# Altium footprint library ic.PcbLib: 68 footprints (part 4 of 5)
Each footprint in its own frame and in the unit in brackets; x right, y up, seen from the top. Pads: shape width x height; smd on the part's side, far side on the other; paste and mask are expansions set on the pad; w line width, h text height; cw(c..) or ccw(c..) is an arc to the next point about the centre after c.
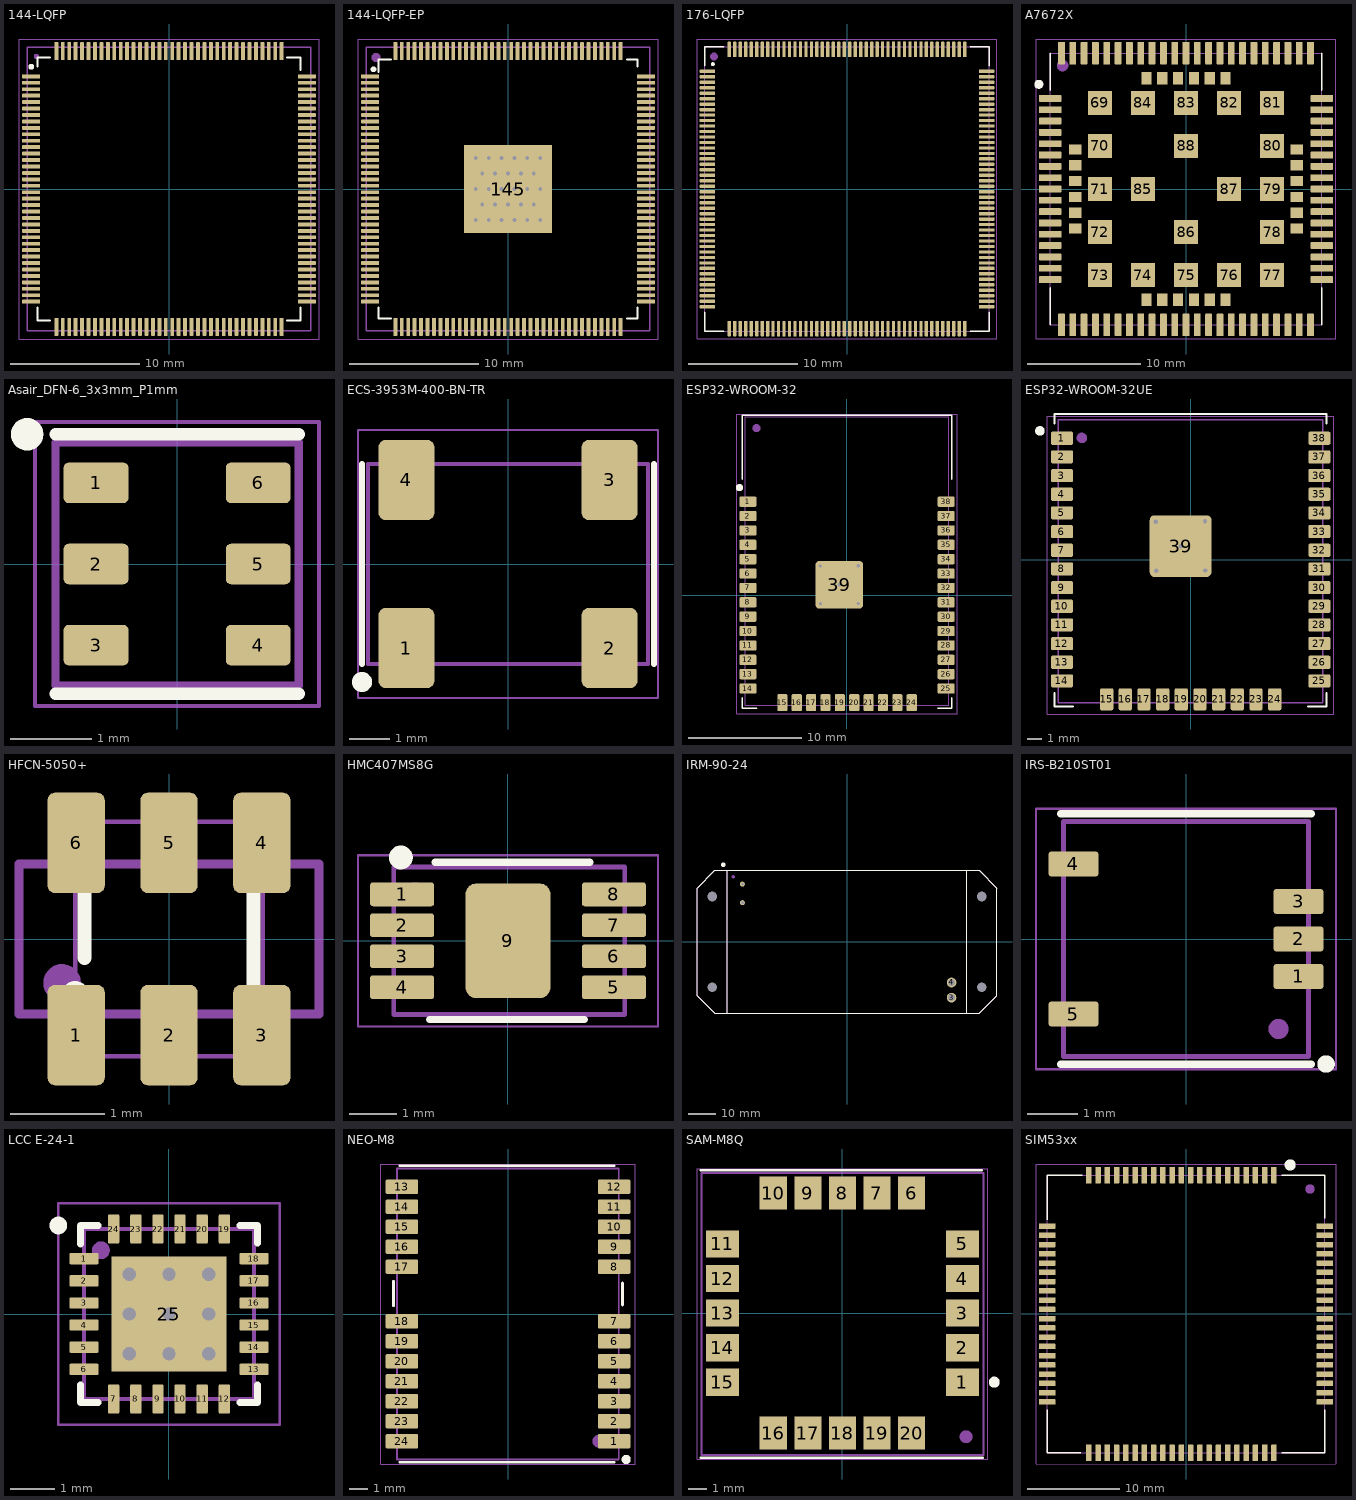
[diagram p3: the footprints below, top view; thin cyan lines are the x and y axes]

## 144-LQFP [mm] "Thin QFP, 144-Leads, Body 20x20mm, Pitch 0.5mm, IPC Medium Density"
height 1.6
pads (144):
  rrect25% 1.4x0.3 smd: 1(-10.7,8.75) 2(-10.7,8.25) 3(-10.7,7.75) 4(-10.7,7.25) 5(-10.7,6.75) 6(-10.7,6.25) 7(-10.7,5.75) 8(-10.7,5.25) 9(-10.7,4.75) 10(-10.7,4.25) 11(-10.7,3.75) 12(-10.7,3.25) 13(-10.7,2.75) 14(-10.7,2.25) 15(-10.7,1.75) 16(-10.7,1.25) 17(-10.7,0.75) 18(-10.7,0.25) 19(-10.7,-0.25) 20(-10.7,-0.75) 21(-10.7,-1.25) 22(-10.7,-1.75) 23(-10.7,-2.25) 24(-10.7,-2.75) 25(-10.7,-3.25) 26(-10.7,-3.75) 27(-10.7,-4.25) 28(-10.7,-4.75) 29(-10.7,-5.25) 30(-10.7,-5.75) 31(-10.7,-6.25) 32(-10.7,-6.75) 33(-10.7,-7.25) 34(-10.7,-7.75) 35(-10.7,-8.25) 36(-10.7,-8.75) 73(10.7,-8.75) 74(10.7,-8.25) 75(10.7,-7.75) 76(10.7,-7.25) 77(10.7,-6.75) 78(10.7,-6.25) 79(10.7,-5.75) 80(10.7,-5.25) 81(10.7,-4.75) 82(10.7,-4.25) 83(10.7,-3.75) 84(10.7,-3.25) 85(10.7,-2.75) 86(10.7,-2.25) 87(10.7,-1.75) 88(10.7,-1.25) 89(10.7,-0.75) 90(10.7,-0.25) 91(10.7,0.25) 92(10.7,0.75) 93(10.7,1.25) 94(10.7,1.75) 95(10.7,2.25) 96(10.7,2.75) 97(10.7,3.25) 98(10.7,3.75) 99(10.7,4.25) 100(10.7,4.75) 101(10.7,5.25) 102(10.7,5.75) 103(10.7,6.25) 104(10.7,6.75) 105(10.7,7.25) 106(10.7,7.75) 107(10.7,8.25) 108(10.7,8.75)
  rrect25% 0.3x1.4 smd: 37(-8.75,-10.7) 38(-8.25,-10.7) 39(-7.75,-10.7) 40(-7.25,-10.7) 41(-6.75,-10.7) 42(-6.25,-10.7) 43(-5.75,-10.7) 44(-5.25,-10.7) 45(-4.75,-10.7) 46(-4.25,-10.7) 47(-3.75,-10.7) 48(-3.25,-10.7) 49(-2.75,-10.7) 50(-2.25,-10.7) 51(-1.75,-10.7) 52(-1.25,-10.7) 53(-0.75,-10.7) 54(-0.25,-10.7) 55(0.25,-10.7) 56(0.75,-10.7) 57(1.25,-10.7) 58(1.75,-10.7) 59(2.25,-10.7) 60(2.75,-10.7) 61(3.25,-10.7) 62(3.75,-10.7) 63(4.25,-10.7) 64(4.75,-10.7) 65(5.25,-10.7) 66(5.75,-10.7) 67(6.25,-10.7) 68(6.75,-10.7) 69(7.25,-10.7) 70(7.75,-10.7) 71(8.25,-10.7) 72(8.75,-10.7) 109(8.75,10.7) 110(8.25,10.7) 111(7.75,10.7) 112(7.25,10.7) 113(6.75,10.7) 114(6.25,10.7) 115(5.75,10.7) 116(5.25,10.7) 117(4.75,10.7) 118(4.25,10.7) 119(3.75,10.7) 120(3.25,10.7) 121(2.75,10.7) 122(2.25,10.7) 123(1.75,10.7) 124(1.25,10.7) 125(0.75,10.7) 126(0.25,10.7) 127(-0.25,10.7) 128(-0.75,10.7) 129(-1.25,10.7) 130(-1.75,10.7) 131(-2.25,10.7) 132(-2.75,10.7) 133(-3.25,10.7) 134(-3.75,10.7) 135(-4.25,10.7) 136(-4.75,10.7) 137(-5.25,10.7) 138(-5.75,10.7) 139(-6.25,10.7) 140(-6.75,10.7) 141(-7.25,10.7) 142(-7.75,10.7) 143(-8.25,10.7) 144(-8.75,10.7)
Top Overlay:
  circle w0.254: c-10.7,9.5 r0.1
  lines w0.15: -10.2,-9.2 -10.2,-10.2 -9.25,-10.2 ; -10.2,9.5 -10.2,10.2 -9.25,10.2 ; 9.15,-10.2 10.2,-10.2 10.2,-9.2 ; 9.15,10.2 10.2,10.2 10.2,9.25
Top Assy:
  circle w0.2: c-10.3,10.3 r0.1
  lines w0.1: -11,-11 11,-11 11,11 -11,11 -11,-11
  text ".Designator" at 0,0 h1
Top Cortyard:
  lines w0.05: -11.65,-11.65 11.65,-11.65 11.65,11.65 -11.65,11.65 -11.65,-11.65
3D body "LQFP-176.STEP": height 2, standoff 0.1, extent -11,-11 11,11

## 144-LQFP-EP [mm] "Thin QFP, 144-Leads, Body 20x20mm, Pitch 0.5mm, IPC Medium Density"
height 1.6
pads (173):
  rrect25% 1.4x0.3 smd: 1(-10.7,8.75) 2(-10.7,8.25) 3(-10.7,7.75) 4(-10.7,7.25) 5(-10.7,6.75) 6(-10.7,6.25) 7(-10.7,5.75) 8(-10.7,5.25) 9(-10.7,4.75) 10(-10.7,4.25) 11(-10.7,3.75) 12(-10.7,3.25) 13(-10.7,2.75) 14(-10.7,2.25) 15(-10.7,1.75) 16(-10.7,1.25) 17(-10.7,0.75) 18(-10.7,0.25) 19(-10.7,-0.25) 20(-10.7,-0.75) 21(-10.7,-1.25) 22(-10.7,-1.75) 23(-10.7,-2.25) 24(-10.7,-2.75) 25(-10.7,-3.25) 26(-10.7,-3.75) 27(-10.7,-4.25) 28(-10.7,-4.75) 29(-10.7,-5.25) 30(-10.7,-5.75) 31(-10.7,-6.25) 32(-10.7,-6.75) 33(-10.7,-7.25) 34(-10.7,-7.75) 35(-10.7,-8.25) 36(-10.7,-8.75) 73(10.7,-8.75) 74(10.7,-8.25) 75(10.7,-7.75) 76(10.7,-7.25) 77(10.7,-6.75) 78(10.7,-6.25) 79(10.7,-5.75) 80(10.7,-5.25) 81(10.7,-4.75) 82(10.7,-4.25) 83(10.7,-3.75) 84(10.7,-3.25) 85(10.7,-2.75) 86(10.7,-2.25) 87(10.7,-1.75) 88(10.7,-1.25) 89(10.7,-0.75) 90(10.7,-0.25) 91(10.7,0.25) 92(10.7,0.75) 93(10.7,1.25) 94(10.7,1.75) 95(10.7,2.25) 96(10.7,2.75) 97(10.7,3.25) 98(10.7,3.75) 99(10.7,4.25) 100(10.7,4.75) 101(10.7,5.25) 102(10.7,5.75) 103(10.7,6.25) 104(10.7,6.75) 105(10.7,7.25) 106(10.7,7.75) 107(10.7,8.25) 108(10.7,8.75)
  rrect25% 0.3x1.4 smd: 37(-8.75,-10.7) 38(-8.25,-10.7) 39(-7.75,-10.7) 40(-7.25,-10.7) 41(-6.75,-10.7) 42(-6.25,-10.7) 43(-5.75,-10.7) 44(-5.25,-10.7) 45(-4.75,-10.7) 46(-4.25,-10.7) 47(-3.75,-10.7) 48(-3.25,-10.7) 49(-2.75,-10.7) 50(-2.25,-10.7) 51(-1.75,-10.7) 52(-1.25,-10.7) 53(-0.75,-10.7) 54(-0.25,-10.7) 55(0.25,-10.7) 56(0.75,-10.7) 57(1.25,-10.7) 58(1.75,-10.7) 59(2.25,-10.7) 60(2.75,-10.7) 61(3.25,-10.7) 62(3.75,-10.7) 63(4.25,-10.7) 64(4.75,-10.7) 65(5.25,-10.7) 66(5.75,-10.7) 67(6.25,-10.7) 68(6.75,-10.7) 69(7.25,-10.7) 70(7.75,-10.7) 71(8.25,-10.7) 72(8.75,-10.7) 109(8.75,10.7) 110(8.25,10.7) 111(7.75,10.7) 112(7.25,10.7) 113(6.75,10.7) 114(6.25,10.7) 115(5.75,10.7) 116(5.25,10.7) 117(4.75,10.7) 118(4.25,10.7) 119(3.75,10.7) 120(3.25,10.7) 121(2.75,10.7) 122(2.25,10.7) 123(1.75,10.7) 124(1.25,10.7) 125(0.75,10.7) 126(0.25,10.7) 127(-0.25,10.7) 128(-0.75,10.7) 129(-1.25,10.7) 130(-1.75,10.7) 131(-2.25,10.7) 132(-2.75,10.7) 133(-3.25,10.7) 134(-3.75,10.7) 135(-4.25,10.7) 136(-4.75,10.7) 137(-5.25,10.7) 138(-5.75,10.7) 139(-6.25,10.7) 140(-6.75,10.7) 141(-7.25,10.7) 142(-7.75,10.7) 143(-8.25,10.7) 144(-8.75,10.7)
  round 0.7 hole 0.3: 145(-2.5,-2.4) 145(-2.5,0) 145(-2.5,2.4) 145(-2,-1.2) 145(-2,1.2) 145(-1.5,-2.4) 145(-1.5,0) 145(-1.5,2.4) 145(-1,-1.2) 145(-1,1.2) 145(-0.5,-2.4) 145(-0.5,0) 145(-0.5,2.4) 145(0,-1.2) 145(0,1.2) 145(0.5,-2.4) 145(0.5,0) 145(0.5,2.4) 145(1,-1.2) 145(1,1.2) 145(1.5,-2.4) 145(1.5,0) 145(1.5,2.4) 145(2,-1.2) 145(2,1.2) 145(2.5,-2.4) 145(2.5,0) 145(2.5,2.4)
  rect 6.85x6.85 smd: 145(0,0)
Top Overlay:
  lines w0.15: -10.05,-9.2 -10.05,-10.05 -9.1,-10.05 ; -10.05,9.1 -10.05,10.05 -9.1,10.05 ; 9.25,-10.05 10.05,-10.05 10.05,-9.2 ; 9.25,10.05 10.05,10.05 10.05,9.5
  lines w0.254: -10.355,9.268 cw(c-10.45,9.3) -10.35,9.3
Top Assy:
  lines w0.1: -11,-11 -11,11 11,11 11,-11 -11,-11
  lines w0.5: -10.15,10.2 cw(c-10.249,10.211) -10.149,10.211
  text ".Designator" at 0,0 h1
Top Cortyard:
  lines w0.05: -11.65,-11.65 -11.65,11.65 11.65,11.65 11.65,-11.65 -11.65,-11.65
  lines w0.1: -0.5,0 0.5,0 -0.5,0 ; 0,-0.5 0,0.5 0,-0.5
3D body "LQFP-176.STEP": height 2, standoff 0.1, extent -11,-11 11,11

## 176-LQFP [mm]
pads (176):
  rrect25% 1.4x0.3 smd: 1(-12.75,10.75) 2(-12.75,10.25) 3(-12.75,9.75) 4(-12.75,9.25) 5(-12.75,8.75) 6(-12.75,8.25) 7(-12.75,7.75) 8(-12.75,7.25) 9(-12.75,6.75) 10(-12.75,6.25) 11(-12.75,5.75) 12(-12.75,5.25) 13(-12.75,4.75) 14(-12.75,4.25) 15(-12.75,3.75) 16(-12.75,3.25) 17(-12.75,2.75) 18(-12.75,2.25) 19(-12.75,1.75) 20(-12.75,1.25) 21(-12.75,0.75) 22(-12.75,0.25) 23(-12.75,-0.25) 24(-12.75,-0.75) 25(-12.75,-1.25) 26(-12.75,-1.75) 27(-12.75,-2.25) 28(-12.75,-2.75) 29(-12.75,-3.25) 30(-12.75,-3.75) 31(-12.75,-4.25) 32(-12.75,-4.75) 33(-12.75,-5.25) 34(-12.75,-5.75) 35(-12.75,-6.25) 36(-12.75,-6.75) 37(-12.75,-7.25) 38(-12.75,-7.75) 39(-12.75,-8.25) 40(-12.75,-8.75) 41(-12.75,-9.25) 42(-12.75,-9.75) 43(-12.75,-10.25) 44(-12.75,-10.75) 89(12.75,-10.75) 90(12.75,-10.25) 91(12.75,-9.75) 92(12.75,-9.25) 93(12.75,-8.75) 94(12.75,-8.25) 95(12.75,-7.75) 96(12.75,-7.25) 97(12.75,-6.75) 98(12.75,-6.25) 99(12.75,-5.75) 100(12.75,-5.25) 101(12.75,-4.75) 102(12.75,-4.25) 103(12.75,-3.75) 104(12.75,-3.25) 105(12.75,-2.75) 106(12.75,-2.25) 107(12.75,-1.75) 108(12.75,-1.25) 109(12.75,-0.75) 110(12.75,-0.25) 111(12.75,0.25) 112(12.75,0.75) 113(12.75,1.25) 114(12.75,1.75) 115(12.75,2.25) 116(12.75,2.75) 117(12.75,3.25) 118(12.75,3.75) 119(12.75,4.25) 120(12.75,4.75) 121(12.75,5.25) 122(12.75,5.75) 123(12.75,6.25) 124(12.75,6.75) 125(12.75,7.25) 126(12.75,7.75) 127(12.75,8.25) 128(12.75,8.75) 129(12.75,9.25) 130(12.75,9.75) 131(12.75,10.25) 132(12.75,10.75)
  rrect25% 0.3x1.4 smd: 45(-10.75,-12.75) 46(-10.25,-12.75) 47(-9.75,-12.75) 48(-9.25,-12.75) 49(-8.75,-12.75) 50(-8.25,-12.75) 51(-7.75,-12.75) 52(-7.25,-12.75) 53(-6.75,-12.75) 54(-6.25,-12.75) 55(-5.75,-12.75) 56(-5.25,-12.75) 57(-4.75,-12.75) 58(-4.25,-12.75) 59(-3.75,-12.75) 60(-3.25,-12.75) 61(-2.75,-12.75) 62(-2.25,-12.75) 63(-1.75,-12.75) 64(-1.25,-12.75) 65(-0.75,-12.75) 66(-0.25,-12.75) 67(0.25,-12.75) 68(0.75,-12.75) 69(1.25,-12.75) 70(1.75,-12.75) 71(2.25,-12.75) 72(2.75,-12.75) 73(3.25,-12.75) 74(3.75,-12.75) 75(4.25,-12.75) 76(4.75,-12.75) 77(5.25,-12.75) 78(5.75,-12.75) 79(6.25,-12.75) 80(6.75,-12.75) 81(7.25,-12.75) 82(7.75,-12.75) 83(8.25,-12.75) 84(8.75,-12.75) 85(9.25,-12.75) 86(9.75,-12.75) 87(10.25,-12.75) 88(10.75,-12.75) 133(10.75,12.75) 134(10.25,12.75) 135(9.75,12.75) 136(9.25,12.75) 137(8.75,12.75) 138(8.25,12.75) 139(7.75,12.75) 140(7.25,12.75) 141(6.75,12.75) 142(6.25,12.75) 143(5.75,12.75) 144(5.25,12.75) 145(4.75,12.75) 146(4.25,12.75) 147(3.75,12.75) 148(3.25,12.75) 149(2.75,12.75) 150(2.25,12.75) 151(1.75,12.75) 152(1.25,12.75) 153(0.75,12.75) 154(0.25,12.75) 155(-0.25,12.75) 156(-0.75,12.75) 157(-1.25,12.75) 158(-1.75,12.75) 159(-2.25,12.75) 160(-2.75,12.75) 161(-3.25,12.75) 162(-3.75,12.75) 163(-4.25,12.75) 164(-4.75,12.75) 165(-5.25,12.75) 166(-5.75,12.75) 167(-6.25,12.75) 168(-6.75,12.75) 169(-7.25,12.75) 170(-7.75,12.75) 171(-8.25,12.75) 172(-8.75,12.75) 173(-9.25,12.75) 174(-9.75,12.75) 175(-10.25,12.75) 176(-10.75,12.75)
Top Overlay:
  circle w0.254: c-12.25,11.4 r0.05
  lines w0.15: -13,-11.25 -13,-13 -11.25,-13 ; -13,11.25 -13,13 -11.25,13 ; 11.25,-13 13,-13 13,-11.25 ; 11.25,13 13,13 13,11.25
Top Assy:
  lines w0.1: -13,-13 13,-13 13,13 -13,13 -13,-13
  lines w0.5: -12.061,12.145 ccw(c-12.15,12.1) -12.05,12.1
  text ".Designator" at 0,0 h1
Top Cortyard:
  lines w0.05: -13.7,-13.7 -13.7,13.7 13.7,13.7 13.7,-13.7 -13.7,-13.7
3D body: height 1.6, standoff 0, extent -12,-12 12,12

## A7672X [mm]
pads (124):
  rrect25% 2x0.6 smd: 1(-12,8) 2(-12,7) 3(-12,6) 4(-12,5) 5(-12,4) 6(-12,3) 7(-12,2) 8(-12,1) 9(-12,0) 10(-12,-1) 11(-12,-2) 12(-12,-3) 13(-12,-4) 14(-12,-5) 15(-12,-6) 16(-12,-7) 17(-12,-8) 35(12,-8) 36(12,-7) 37(12,-6) 38(12,-5) 39(12,-4) 40(12,-3) 41(12,-2) 42(12,-1) 43(12,0) 44(12,1) 45(12,2) 46(12,3) 47(12,4) 48(12,5) 49(12,6) 50(12,7) 51(12,8)
  rrect25% 0.6x2 smd: 18(-8,-12) 19(-7,-12) 20(-6,-12) 21(-5,-12) 22(-4,-12) 23(-3,-12) 24(-2,-12) 25(-1,-12) 26(0,-12) 27(1,-12) 28(2,-12) 29(3,-12) 30(4,-12) 31(5,-12) 32(6,-12) 33(7,-12) 34(8,-12) 52(8,12) 53(7,12) 54(6,12) 55(5,12) 56(4,12) 57(3,12) 58(2,12) 59(1,12) 60(0,12) 61(-1,12) 62(-2,12) 63(-3,12) 64(-4,12) 65(-5,12) 66(-6,12) 67(-7,12) 68(-8,12) 89(-11,-12) 90(-10,-12) 91(-9,-12) 92(9,-12) 93(10,-12) 94(11,-12) 95(11,12) 96(10,12) 97(9,12) 98(-9,12) 99(-10,12) 100(-11,12)
  rect 2.1x2.1 smd: 69(-7.6,7.6) 70(-7.6,3.8) 71(-7.6,0) 72(-7.6,-3.8) 73(-7.6,-7.6) 74(-3.8,-7.6) 75(0,-7.6) 76(3.8,-7.6) 77(7.6,-7.6) 78(7.6,-3.8) 79(7.6,0) 80(7.6,3.8) 81(7.6,7.6) 82(3.8,7.6) 83(0,7.6) 84(-3.8,7.6) 85(-3.8,0) 86(0,-3.8) 87(3.8,0) 88(0,3.8)
  rect 1.1x0.9 smd: 101(-9.8,3.5) 102(-9.8,2.1) 103(-9.8,0.7) 104(-9.8,-0.7) 105(-9.8,-2.1) 106(-9.8,-3.5) 113(9.8,-3.5) 114(9.8,-2.1) 115(9.8,-0.7) 116(9.8,0.7) 117(9.8,2.1) 118(9.8,3.5)
  rect 0.9x1.1 smd: 107(-3.5,-9.8) 108(-2.1,-9.8) 109(-0.7,-9.8) 110(0.7,-9.8) 111(2.1,-9.8) 112(3.5,-9.8) 119(3.5,9.8) 120(2.1,9.8) 121(0.7,9.8) 122(-0.7,9.8) 123(-2.1,9.8) 124(-3.5,9.8)
Top Overlay:
  circle w0.4: c-13,9.25 r0.2
  lines w0.15: -12,-12 -12,-8.75 ; -12,8.75 -12,12 ; 12,-12 12,-8.75 ; 12,8.75 12,12
Top Assy:
  circle w0.8: c-10.9,10.9 r0.1
  lines w0.1: -12,-12 12,-12 12,12 -12,12 -12,-12
  text ".Designator" at 0,0 h1
Top Cortyard:
  lines w0.05: -13.25,-13.25 13.25,-13.25 13.25,13.25 -13.25,13.25 -13.25,-13.25
3D body "step_temp.STEP": height 2.6, standoff 0, extent -12,-12 12,12

## Asair_DFN-6_3x3mm_P1mm [mm]
height 2
pads (6):
  rrect25% 0.8x0.5 smd: 1(-1,1) 2(-1,0) 3(-1,-1) 4(1,-1) 5(1,0) 6(1,1)
Top Overlay:
  circle w0.2: c-1.85,1.6 r0.1
  lines w0.15: -1.5,-1.6 1.5,-1.6 ; -1.5,1.6 1.5,1.6
Top Assy:
  circle w0.2: c-1.05,1 r0.1
  lines w0.1: -1.5,-1.5 1.5,-1.5 1.5,1.5 -1.5,1.5 -1.5,-1.5
  text ".Designator" at 0,0 h1
Top Cortyard:
  lines w0.05: -1.75,-1.75 1.75,-1.75 1.75,1.75 -1.75,1.75 -1.75,-1.75
3D body "User Library-dfn6_3x3_rm0_95.step": height 0.8, standoff 0, extent -1.55,-1.5 1.55,1.5

## ECS-3953M-400-BN-TR [mm]
height 2.1
pads (4):
  rrect25% 1.4x2 smd: 1(-2.54,-2.1) 2(2.54,-2.1) 3(2.54,2.1) 4(-2.54,2.1)
Top Overlay:
  circle w0.3: c-3.65,-2.95 r0.1
  lines w0.15: -3.65,-2.5 -3.65,2.5 ; 3.65,-2.5 3.65,2.5
Top Assy:
  circle w0.2: c-2.7,-1.8 r0.1
  lines w0.1: -3.5,-2.5 -3.5,2.5 3.5,2.5 3.5,-2.5 -3.5,-2.5
  text ".Designator" at 0,0 h1
Top Cortyard:
  lines w0.05: -3.75,-3.35 -3.75,3.35 3.75,3.35 3.75,-3.35 -3.75,-3.35
3D body "ECS-3953M-400-BN-TR.step": height 1.7, standoff 0, extent -3.5,-2.5 3.5,2.5

## ESP32-WROOM-32 [mm]
height 3.1
pads (39):
  rrect25% 1.5x0.9 smd: 1(-8.75,8.25) 2(-8.75,6.98) 3(-8.75,5.71) 4(-8.75,4.44) 5(-8.75,3.17) 6(-8.75,1.9) 7(-8.75,0.63) 8(-8.75,-0.64) 9(-8.75,-1.91) 10(-8.75,-3.18) 11(-8.75,-4.45) 12(-8.75,-5.72) 13(-8.75,-6.99) 14(-8.75,-8.26) 25(8.76,-8.26) 26(8.76,-6.99) 27(8.76,-5.72) 28(8.76,-4.45) 29(8.76,-3.18) 30(8.76,-1.91) 31(8.76,-0.64) 32(8.76,0.63) 33(8.76,1.9) 34(8.76,3.17) 35(8.76,4.44) 36(8.76,5.71) 37(8.76,6.98) 38(8.76,8.25)
  rrect25% 0.9x1.5 smd: 15(-5.71,-9.51) 16(-4.44,-9.51) 17(-3.17,-9.51) 18(-1.9,-9.51) 19(-0.63,-9.51) 20(0.64,-9.51) 21(1.91,-9.51) 22(3.18,-9.51) 23(4.45,-9.51) 24(5.72,-9.51)
  rrect15% 4.2x4.2 smd: 39(-0.68,0.91)
via -2.34,-0.77 diameter 0.6 hole 0.3
via -2.36,2.57 diameter 0.6 hole 0.3
via 0.98,2.59 diameter 0.6 hole 0.3
via 1,-0.75 diameter 0.6 hole 0.3
via -0.68,0.91 diameter 0.6 hole 0.3
Top Overlay:
  circle w0.4: c-9.5,9.5 r0.125
  lines w0.15: -9.25,-9.1 -9.25,-10 -8,-10 ; -9.25,10.25 -9.25,15.9 9.25,15.9 9.25,10.25 ; 8.01,-10 9.25,-10 9.25,-9.1
Top Assy:
  circle w0.5: c-8,14.75 r0.1
  lines w0.1: -9,15.74 -9,-9.75 9,-9.75 9,15.75 -9,15.75
  text ".Designator" at 0,0 h1
Top Cortyard:
  lines w0.05: -9.75,-10.51 9.75,-10.51 9.75,16 -9.75,16 -9.75,-10.51
3D body "ESP32-WROOM-32.step": height 3.1, standoff 0, extent -9,-9.755 9,15.745

## ESP32-WROOM-32UE [mm]
height 3.1
pads (39):
  rrect25% 1.5x0.9 smd: 1(-8.75,8.25) 2(-8.75,6.98) 3(-8.75,5.71) 4(-8.75,4.44) 5(-8.75,3.17) 6(-8.75,1.9) 7(-8.75,0.63) 8(-8.75,-0.64) 9(-8.75,-1.91) 10(-8.75,-3.18) 11(-8.75,-4.45) 12(-8.75,-5.72) 13(-8.75,-6.99) 14(-8.75,-8.26) 25(8.76,-8.26) 26(8.76,-6.99) 27(8.76,-5.72) 28(8.76,-4.45) 29(8.76,-3.18) 30(8.76,-1.91) 31(8.76,-0.64) 32(8.76,0.63) 33(8.76,1.9) 34(8.76,3.17) 35(8.76,4.44) 36(8.76,5.71) 37(8.76,6.98) 38(8.76,8.25)
  rrect25% 0.9x1.5 smd: 15(-5.71,-9.51) 16(-4.44,-9.51) 17(-3.17,-9.51) 18(-1.9,-9.51) 19(-0.63,-9.51) 20(0.64,-9.51) 21(1.91,-9.51) 22(3.18,-9.51) 23(4.45,-9.51) 24(5.72,-9.51)
  rrect15% 4.2x4.2 smd: 39(-0.68,0.91)
via -0.68,0.91 diameter 0.6 hole 0.3
via 1,-0.75 diameter 0.6 hole 0.3
via 0.98,2.59 diameter 0.6 hole 0.3
via -2.36,2.57 diameter 0.6 hole 0.3
via -2.34,-0.77 diameter 0.6 hole 0.3
Top Overlay:
  circle w0.4: c-10.25,8.75 r0.125
  lines w0.15: -9.25,-9.1 -9.25,-10 -8,-10 ; -9.25,9.25 -9.25,9.9 9.25,9.9 9.25,9.25 ; 8.01,-10 9.25,-10 9.25,-9.1
Top Assy:
  circle w0.5: c-7.4,8.275 r0.1
  lines w0.1: -9,-9.75 9,-9.75 9,9.5 -9,9.5 -9,-9.75
  text ".Designator" at 0,0 h1
Top Cortyard:
  lines w0.05: -9.75,-10.51 -9.75,9.75 9.75,9.75 9.75,-10.51 -9.75,-10.51
3D body "ESP32-WROOM-32UE 3D Model.STEP": height 3.23, standoff 0.03, extent -9,-9.75 9,9.45

## HFCN-5050+ [mm]
pads (6):
  rrect25% 0.61x1.07 smd: 1(-0.99,-1.025) 2(0,-1.025) 3(0.99,-1.025) 4(0.99,1.025) 5(0,1.025) 6(-0.99,1.025)
Top Overlay:
  circle w0.2: c-1,-0.6 r0.05
  lines w0.15: -0.9,-0.2 -0.9,0.8 ; 0.9,-0.8 0.9,0.75
Top Assy:
  circle w0.2: c-1.141,-0.468 r0.1
  lines w0.1: -1.6,-0.8 -1.6,0.8 1.6,0.8 1.6,-0.8 -1.6,-0.8
  text ".Designator" at -0.957,-0.349 h0.75
Top Cortyard:
  lines w0.05: -1,-1.25 1,-1.25 1,1.25 -1,1.25 -1,-1.25
3D body: height 0.89, standoff 0, extent -1.6,-0.8 1.6,0.8

## HMC407MS8G [mm]
height 1.1
pads (9):
  rrect25% 1.35x0.5 smd: 1(-2.225,0.975) 2(-2.225,0.325) 3(-2.225,-0.325) 4(-2.225,-0.975) 5(2.225,-0.975) 6(2.225,-0.325) 7(2.225,0.325) 8(2.225,0.975)
  rrect25% 1.78x2.41 smd: 9(0,0)
Top Overlay:
  circle w0.25: c-2.25,1.75 r0.125
  lines w0.15: -1.65,-1.65 1.6,-1.65 ; -1.531,1.65 1.719,1.65
Board:
  lines w0.1: -0.5,0 0.5,0 ; 0,-0.5 0,0.5
Top Assy:
  circle w0.35: c-1.95,1 r0.05
  lines w0.1: -2.4,-1.55 -2.4,1.55 2.45,1.55 2.45,-1.55 1.238,-1.55 0.35,-1.55 -0.088,-1.55 -2.4,-1.55
  text ".Designator" at -0.05,-0.117 h1
Top Cortyard:
  lines w0.05: -3.15,-1.8 -3.15,1.8 3.15,1.8 3.15,-1.8 -3.15,-1.8
3D body "HMC407MS8G.step": height 1.1, standoff 0, extent -2.44,-1.55 2.44,1.55

## IRM-90-24 [mm]
height 1
pads (8):
  round 1.8 hole 1.2 unplated: 1(-38,21) 2(-38,14.25)
  round 3.5 hole 2.5 unplated: 3(38,-20.25) 4(38,-14.75)
  round 0 hole 3.5 unplated mask+1.9: 11(-49,16.5) 11(49,16.5) 12(-49,-16.5) 12(49,-16.5)
Top Overlay:
  circle w1.5: c-45,28 r0.1
  lines w0.2: -54.5,-19.5 -54.5,19.5 -48,26 48,26 54.5,19.5 54.5,-19.5 48,-26 -48,-26 -54.5,-19.5 ; -43.5,-26 43.5,-26 43.5,26 -43.5,26 -43.5,-26
Top Assy:
  circle w1: c-41.3,23.65 r0.1
  lines w0.1: -43.5,-26 -43.5,26 43.497,26 43.497,-26 -43.5,-26
Top Cortyard:
  lines w0.2: -54.5,-19.5 -54.5,19.5 -48,26 48,26 54.5,19.5 54.5,-19.5 48,-26 -48,-26 -54.5,-19.5
3D body: height 33.5, standoff 0, extent -43.5,-26 43.5,26

## IRS-B210ST01 [mm]
pads (5):
  rrect25% 1x0.5 smd: 1(2.25,-0.75) 2(2.25,0) 3(2.25,0.75) 4(-2.25,1.5) 5(-2.25,-1.5)
Top Overlay:
  circle w0.25: c2.8,-2.5 r0.05
  lines w0.15: -2.5,-2.5 2.5,-2.5 ; -2.5,2.5 2.5,2.5
Top Assy:
  circle w0.2: c1.85,-1.8 r0.1
  lines w0.1: -2.45,-2.35 -2.45,2.35 2.45,2.35 2.45,-2.35 -2.45,-2.35
  text ".Designator" at 0,0 h1
Top Cortyard:
  lines w0.05: -3,-2.6 -3,2.6 3,2.6 3,-2.5 3,-2.6 -3,-2.6
3D body: height 2.2, standoff 0, extent -2.45,-2.372 2.466,2.35

## LCC E-24-1 [mm] "HMC525ALC4"
height 0.8
pads (25):
  rrect25% 0.66x0.254 smd mask+0: 1(-1.92,1.25) 2(-1.92,0.75) 3(-1.92,0.25) 4(-1.92,-0.25) 5(-1.92,-0.75) 6(-1.92,-1.25) 13(1.92,-1.25) 14(1.92,-0.75) 15(1.92,-0.25) 16(1.92,0.25) 17(1.92,0.75) 18(1.92,1.25)
  rrect25% 0.254x0.66 smd mask+0: 7(-1.25,-1.92) 8(-0.75,-1.92) 9(-0.25,-1.92) 10(0.25,-1.92) 11(0.75,-1.92) 12(1.25,-1.92) 19(1.25,1.92) 20(0.75,1.92) 21(0.25,1.92) 22(-0.25,1.92) 23(-0.75,1.92) 24(-1.25,1.92)
  rect 2.6x2.6 smd: 25(0,0)
via -0.9,-0.9 diameter 0.6 hole 0.3
via 0.9,-0.9 diameter 0.6 hole 0.3
via 0.9,0.9 diameter 0.6 hole 0.3
via -0.9,0.9 diameter 0.6 hole 0.3
via 0,-0.9 diameter 0.6 hole 0.3
via 0.9,0 diameter 0.6 hole 0.3
via 0,0.9 diameter 0.6 hole 0.3
via -0.9,0 diameter 0.6 hole 0.3
via 0,0 diameter 0.6 hole 0.3
Top Overlay:
  circle w0.2: c-2.5,2 r0.1
  lines w0.15: -2,-1.6 -2,-2 -1.6,-2 ; -2,1.58 -2,1.98 ; -2,2 -1.6,2 ; 1.6,-2 2,-2 2,-1.6 ; 1.6,2 2,2 2,1.6
Top Solder:
  region: -1.538,-1.5 -1.538,1.44 -2.3,1.44 -2.3,-1.5
  region: 1.5,-1.538 -1.44,-1.538 -1.44,-2.3 1.5,-2.3
  region: 1.538,1.5 1.538,-1.44 2.3,-1.44 2.3,1.5
  rectangle: -1.5,1.538 1.44,2.3
Top Assy:
  circle w0.2: c-1.538,1.44 r0.1
  lines w0.1: -1.92,-1.92 -1.92,1.92 1.92,1.92 1.92,-1.92 -1.92,-1.92
  text ".Designator" at 0,0 h1
Top Cortyard:
  lines w0.05: -2.5,-2.5 -2.5,2.5 2.5,2.5 2.5,-2.5 -2.5,-2.5
3D body "User Library-LCC24_E24_1.STEP": height 1, standoff -0.03, extent -1.98,-1.95 1.92,1.95

## NEO-M8 [mm] "u-blox NEO GNSS module"
pads (24):
  rrect25% 1.8x0.8 smd: 1(5.842,-7) 2(5.842,-5.9) 3(5.842,-4.8) 4(5.842,-3.7) 5(5.842,-2.6) 6(5.842,-1.5) 7(5.842,-0.4) 8(5.842,2.6) 9(5.842,3.7) 10(5.842,4.8) 11(5.842,5.9) 12(5.842,7) 13(-5.842,7) 14(-5.842,5.9) 15(-5.842,4.8) 16(-5.842,3.7) 17(-5.842,2.6) 18(-5.842,-0.4) 19(-5.842,-1.5) 20(-5.842,-2.6) 21(-5.842,-3.7) 22(-5.842,-4.8) 23(-5.842,-5.9) 24(-5.842,-7)
Top Overlay:
  circle w0.3: c6.5,-8 r0.1
  lines w0.15: -6.3,0.45 -6.3,1.8 ; -5.95,-8.15 5.85,-8.15 ; -5.95,8.15 5.85,8.15 ; 6.3,0.5 6.3,1.7
Top Assy:
  circle w0.5: c5,-7 r0.1
  lines w0.1: -6.104,-8 -6.104,8 6.096,8 6.096,-8 -6.104,-8
  text ".Designator" at 0,0 h1
Top Cortyard:
  lines w0.05: -7,-8.25 7,-8.25 7,8.25 -7,8.25 -7,-8.25
3D body "NEO (STEP-AP214)_B.STEP": height 2.28, standoff -0.05, extent -6.104,-8 6.096,8

## SAM-M8Q [mm]
pads (20):
  rect 1.8x1.5 smd: 1(6.6,-3.8) 2(6.6,-1.9) 3(6.6,0) 4(6.6,1.9) 5(6.6,3.8) 11(-6.6,3.8) 12(-6.6,1.9) 13(-6.6,0) 14(-6.6,-1.9) 15(-6.6,-3.8)
  rect 1.5x1.8 smd: 6(3.8,6.6) 7(1.9,6.6) 8(0,6.6) 9(-1.9,6.6) 10(-3.8,6.6) 16(-3.8,-6.6) 17(-1.9,-6.6) 18(0,-6.6) 19(1.9,-6.6) 20(3.8,-6.6)
Top Overlay:
  circle w0.3: c8.35,-3.8 r0.15
  lines w0.15: -7.8,-7.95 7.7,-7.95 ; -7.8,7.85 7.65,7.85
Top Assy:
  circle w0.5: c6.8,-6.8 r0.1
  lines w0.1: -7.75,-7.8 7.75,-7.8 7.75,7.7 -7.75,7.7 -7.75,-7.8
  text ".Designator" at 0,0 h1
Top Cortyard:
  lines w0.05: -8,-8.05 -8,7.95 8,7.95 8,-8.05 -8,-8.05
3D body "SAM_AP214.STEP": height 6.41, standoff 0.03, extent -7.75,-7.8 7.75,7.7

## SIM53xx [mm]
pads (82):
  rrect25% 0.6x1.8 smd: 1(9.5,15) 2(8.5,15) 3(7.5,15) 4(6.5,15) 5(5.5,15) 6(4.5,15) 7(3.5,15) 8(2.5,15) 9(1.5,15) 10(0.5,15) 11(-0.5,15) 12(-1.5,15) 13(-2.5,15) 14(-3.5,15) 15(-4.5,15) 16(-5.5,15) 17(-6.5,15) 18(-7.5,15) 19(-8.5,15) 20(-9.5,15) 41(-9.5,-15) 42(-8.5,-15) 43(-7.5,-15) 44(-6.5,-15) 45(-5.5,-15) 46(-4.5,-15) 47(-3.5,-15) 48(-2.5,-15) 49(-1.5,-15) 50(-0.5,-15) 51(0.5,-15) 52(1.5,-15) 53(2.5,-15) 54(3.5,-15) 55(4.5,-15) 56(5.5,-15) 57(6.5,-15) 58(7.5,-15) 59(8.5,-15) 60(9.5,-15) 81(-10.5,15) 82(-10.5,-15)
  rrect25% 1.8x0.6 smd: 21(-15,9.5) 22(-15,8.5) 23(-15,7.5) 24(-15,6.5) 25(-15,5.5) 26(-15,4.5) 27(-15,3.5) 28(-15,2.5) 29(-15,1.5) 30(-15,0.5) 31(-15,-0.5) 32(-15,-1.5) 33(-15,-2.5) 34(-15,-3.5) 35(-15,-4.5) 36(-15,-5.5) 37(-15,-6.5) 38(-15,-7.5) 39(-15,-8.5) 40(-15,-9.5) 61(15,-9.5) 62(15,-8.5) 63(15,-7.5) 64(15,-6.5) 65(15,-5.5) 66(15,-4.5) 67(15,-3.5) 68(15,-2.5) 69(15,-1.5) 70(15,-0.5) 71(15,0.5) 72(15,1.5) 73(15,2.5) 74(15,3.5) 75(15,4.5) 76(15,5.5) 77(15,6.5) 78(15,7.5) 79(15,8.5) 80(15,9.5)
Top Overlay:
  circle w1: c11.25,16.1 r0.1
  lines w0.15: -15,-10.35 -15,-15 -11.35,-15 ; -15,10.2 -15,15 -11.2,15 ; 10.35,-15 15,-15 15,-10.35 ; 10.35,15 15,15 15,10.35
Top Assy:
  circle w0.8: c13.4,13.5 r0.1
  lines w0.1: -15,-15 -15,15 15,15 15,-15 -15,-15
  text ".Designator" at 0,0 h1
Top Cortyard:
  lines w0.05: -16.2,-16.2 16.2,-16.2 16.2,16.2 -16.2,16.2 -16.2,-16.2
3D body "User Library-SIM5320E.step": height 2.9, standoff -0.04, extent -15,-15 15,15